# Altium footprint library RNG_Footprints.PcbLib: 134 footprints (part 8 of 9)
Each footprint in its own frame and in the unit in brackets; x right, y up, seen from the top. Pads: shape width x height; smd on the part's side, far side on the other; paste and mask are expansions set on the pad; w line width, h text height; cw(c..) or ccw(c..) is an arc to the next point about the centre after c.
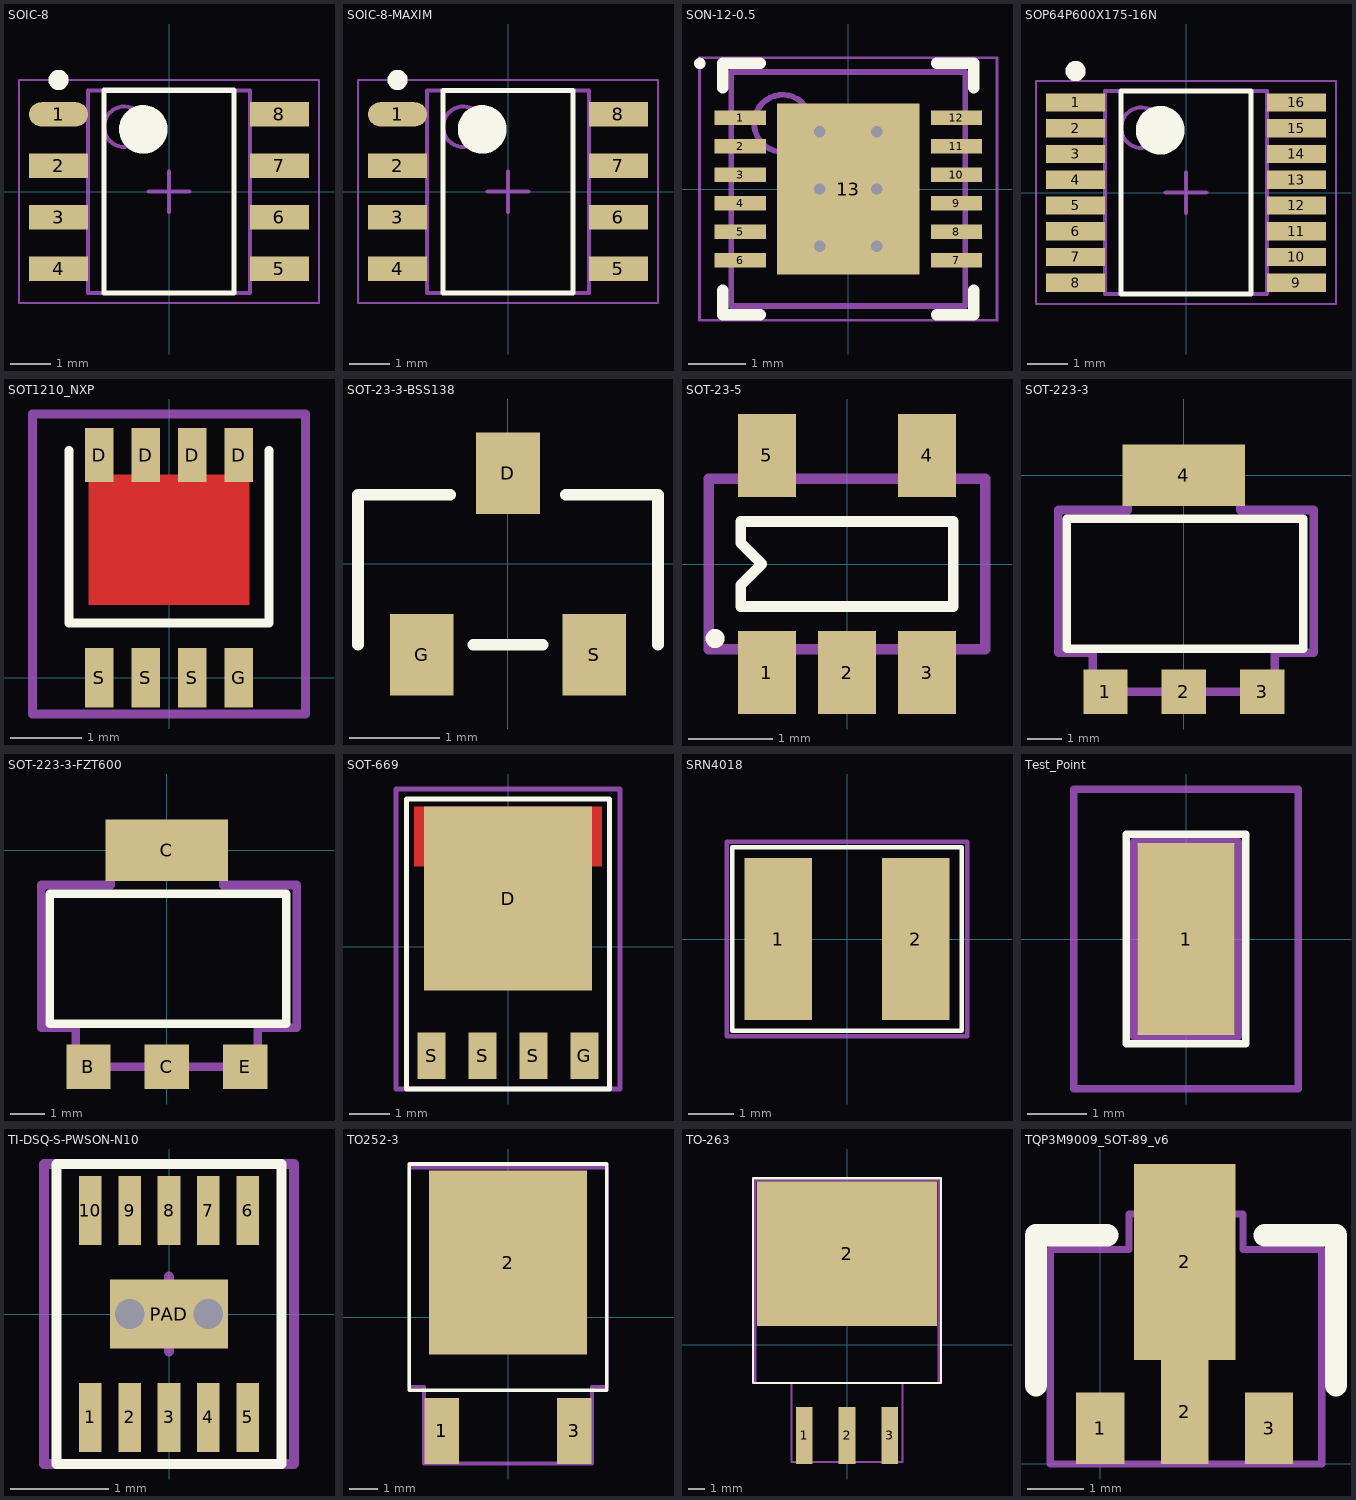
[diagram p7: the footprints below, top view; thin cyan lines are the x and y axes]

## SOIC-8 [mm] "SOIC, 8-Leads, Body 4.90x3.90mm, Pitch 1.27mm, IPC Medium Density"
height 1.75
pads (8):
  oval 1.45x0.6 smd: 1(-2.725,1.905)
  rect 1.45x0.6 smd: 2(-2.725,0.635) 3(-2.725,-0.635) 4(-2.725,-1.905) 5(2.725,-1.905) 6(2.725,-0.635) 7(2.725,0.635) 8(2.725,1.905)
Top Overlay:
  circle w0.6: c-0.637,1.536 r0.3
  circle w0.25: c-2.725,2.755 r0.125
  lines w0.127: -1.6,-2.5 1.6,-2.5 1.6,2.5 -1.6,2.5 -1.6,-2.5
Mechanical 13:
  circle w0.1: c-1.1,1.6 r0.5
  lines w0.1: -2,-2.5 2,-2.5 2,2.5 -2,2.5 -2,-2.5
Mechanical 15:
  lines w0.05: -3.7,-2.75 3.7,-2.75 3.7,2.75 -3.7,2.75 -3.7,-2.75
  lines w0.1: -0.5,0 0.5,0 ; 0,-0.5 0,0.5
3D body "User Library-SOIC127P500X620X175-8.STEP": height 1.75, standoff 0, extent -3.114,-2.5 3.115,2.5

## SOIC-8-MAXIM [mm] "SOIC, 8-Leads, Body 4.90x3.90mm, Pitch 1.27mm, IPC Medium Density"
height 1.75
pads (8):
  oval 1.45x0.6 smd: 1(-2.725,1.905)
  rect 1.45x0.6 smd: 2(-2.725,0.635) 3(-2.725,-0.635) 4(-2.725,-1.905) 5(2.725,-1.905) 6(2.725,-0.635) 7(2.725,0.635) 8(2.725,1.905)
Top Overlay:
  circle w0.25: c-2.725,2.755 r0.125
  circle w0.6: c-0.638,1.538 r0.3
  lines w0.125: -1.6,-2.5 -1.6,2.5 1.6,2.5 1.6,-2.5 -1.6,-2.5
Mechanical 13:
  circle w0.1: c-1.1,1.6 r0.5
  lines w0.1: -2,-2.5 -2,2.5 2,2.5 2,-2.5 -2,-2.5
Mechanical 15:
  lines w0.05: -3.7,-2.75 -3.7,2.75 3.7,2.75 3.7,-2.75 -3.7,-2.75
  lines w0.1: -0.5,0 0.5,0 ; 0,-0.5 0,0.5
3D body "SW3DPS-SO-8-DEFAULT.STEP": height 1.46, standoff 0.01, extent -2.889,-2.413 2.889,2.489

## SON-12-0.5 [mm] "SON, 12-Leads, Body 4.00x4.00mm, Pitch 0.50mm, Thermal Pad 3.00x2.49mm, IPC Medium Density"
height 0.8
pads (13):
  rect 0.9x0.25 smd mask+0: 1(-1.895,1.25) 2(-1.895,0.75) 3(-1.895,0.25) 4(-1.895,-0.25) 5(-1.895,-0.75) 6(-1.895,-1.25) 7(1.895,-1.25) 8(1.895,-0.75) 9(1.895,-0.25) 10(1.895,0.25) 11(1.895,0.75) 12(1.895,1.25)
  rect 2.49x3 smd paste-1.245 mask+0: 13(0,0)
via -0.5,1 diameter 0.5 hole 0.2
via 0.5,1 diameter 0.5 hole 0.2
via -0.5,0 diameter 0.5 hole 0.2
via 0.5,0 diameter 0.5 hole 0.2
via -0.5,-1 diameter 0.5 hole 0.2
via 0.5,-1 diameter 0.5 hole 0.2
Top Overlay:
  circle w0.1: c-2.6,2.2 r0.05
  lines w0.2: -2.2,-1.775 -2.2,-2.2 -1.545,-2.2 ; -2.2,1.775 -2.2,2.2 -1.545,2.2 ; 1.545,-2.2 2.2,-2.2 2.2,-1.775 ; 1.545,2.2 2.2,2.2 2.2,1.775
Top Paste:
  rectangle: -1.15,0.1 -0.1,1.4
  rectangle: -1.15,-1.4 -0.1,-0.1
  rectangle: 0.1,0.1 1.15,1.4
  rectangle: 0.1,-1.4 1.15,-0.1
Mechanical 13:
  circle w0.1: c-1.15,1.15 r0.5
  lines w0.1: -2.05,-2.05 -2.05,2.05 2.05,2.05 2.05,-2.05 -2.05,-2.05
Mechanical 15:
  lines w0.05: -2.605,-2.3 -2.605,2.3 2.605,2.3 2.605,-2.3 -2.605,-2.3
  lines w0.1: -0.5,0 0.5,0 ; 0,-0.5 0,0.5
3D body "User Library-LP39798-2.STEP": height 0.81, standoff 0.01, extent -2,-2 2,2

## SOP64P600X175-16N [mm] "SOP, 16-Leads, Body 4.89x3.90mm, Pitch 0.64mm, IPC Medium Density"
height 1.75
pads (16):
  rect 1.45x0.45 smd: 1(-2.725,2.222) 2(-2.725,1.587) 3(-2.725,0.953) 4(-2.725,0.318) 5(-2.725,-0.318) 6(-2.725,-0.953) 7(-2.725,-1.587) 8(-2.725,-2.222) 9(2.725,-2.222) 10(2.725,-1.587) 11(2.725,-0.953) 12(2.725,-0.318) 13(2.725,0.318) 14(2.725,0.953) 15(2.725,1.587) 16(2.725,2.222)
Top Overlay:
  circle w0.6: c-0.638,1.538 r0.3
  circle w0.25: c-2.725,2.997 r0.125
  lines w0.125: -1.6,-2.5 1.6,-2.5 1.6,2.5 -1.6,2.5 -1.6,-2.5
Mechanical 13:
  circle w0.1: c-1.1,1.6 r0.5
  lines w0.1: -2,-2.5 2,-2.5 2,2.5 -2,2.5 -2,-2.5
Mechanical 15:
  lines w0.05: -3.7,-2.75 3.7,-2.75 3.7,2.75 -3.7,2.75 -3.7,-2.75
  lines w0.1: -0.5,0 0.5,0 ; 0,-0.5 0,0.5
3D body "SW3dPS-SSOP16.STEP": height 1.1, standoff 0, extent -2.997,-2.489 2.997,2.489

## SOT1210_NXP [mm] "NXP SOT-1210 Footprint for LFPAK33"
height 0.9
pads (8):
  rect 0.4x0.75 smd paste-0.05 mask+0.05: D(-0.975,3.11) D(-0.325,3.11) D(0.325,3.11) D(0.975,3.11)
  rect 0.4x0.83 smd paste-0.05 mask+0.05: G(0.975,0) S(-0.975,0) S(-0.325,0) S(0.325,0)
Top Layer:
  rectangle: -1.125,1.015 1.125,2.835
Top Overlay:
  lines w0.127: -1.397,3.175 -1.397,0.762 1.397,0.762 1.397,3.175
Top Paste:
  rectangle: 0.308,1.902 0.944,2.412
  rectangle: -0.944,1.902 -0.308,2.412
  rectangle: 0.308,1.14 0.944,1.65
  rectangle: -0.944,1.14 -0.308,1.65
Mechanical 15:
  lines w0.125: -1.905,-0.508 1.905,-0.508 1.905,3.683 -1.905,3.683 -1.905,-0.508
3D body: height 0.9, standoff 0, extent -1.7,0.602 1.7,3.302

## SOT-23-3-BSS138 [mm] "SOT-23-3 Fairchild BSS138 Pinout"
height 1.12
pads (3):
  rect 0.7x0.9 smd: D(0,1) G(-0.95,-1) S(0.95,-1)
Top Overlay:
  lines w0.127: -1.651,-0.889 -1.651,0.762 -0.635,0.762 ; -0.381,-0.889 0.381,-0.889 ; 0.635,0.762 1.651,0.762 1.651,-0.889
3D body "SOT23.STEP": height 1.23, standoff 0.01, extent -1.5,-1.125 1.5,1.126

## SOT-23-5 [mm] "SOT-23, 5 Pin, for TI LP2985LV"
height 1.19
pads (5):
  rect 0.69x0.99 smd paste-0.05: 1(-0.955,-1.295) 2(0,-1.295) 3(0.955,-1.295) 4(0.955,1.295) 5(-0.955,1.295)
Top Overlay:
  circle w0.127: c-1.574,-0.889 r0.05
  lines w0.127: -1.27,-0.508 1.27,-0.508 1.27,0.508 -1.27,0.508 -1.27,0.254 -1.016,0 -1.27,-0.254 -1.27,-0.508
Mechanical 15:
  lines w0.127: -1.651,-1.016 -1.651,1.016 1.651,1.016 1.651,-1.016 -1.651,-1.016
3D body: height 1.19, standoff 0, extent -1.495,-0.835 1.495,0.835

## SOT-223-3 [mm] "SOT223 pkg, 6.7 x 7.3 x 1.8 mm"
height 1.8
pads (4):
  rect 1.3x1.3 smd paste-0.05: 1(-2.3,-6.35) 2(0,-6.35) 3(2.3,-6.35)
  rect 3.6x1.8 smd paste-0.05: 4(0,0)
Top Overlay:
  lines w0.25: -3.429,-5.08 -3.429,-1.27 3.5,-1.27 3.5,-5.08 -3.429,-5.08
Mechanical 15:
  lines w0.25: -3.683,-5.207 -3.683,-1.016 -1.651,-1.016 -1.651,0 1.651,0 1.651,-1.016 3.81,-1.016 3.81,-5.207 2.667,-5.207 2.667,-6.35 -2.667,-6.35 -2.667,-5.207 -3.683,-5.207
3D body "User Library-SOT223-3.STEP": height 1.7, standoff 0, extent -3.25,-6.675 3.25,0.325

## SOT-223-3-FZT600 [mm] "SOT223 pkg, 6.7 x 7.3 x 1.8 mm"
height 1.8
pads (4):
  rect 1.3x1.3 smd paste-0.05: B(-2.3,-6.35) C(0,-6.35) E(2.3,-6.35)
  rect 3.6x1.8 smd paste-0.05: C(0,0)
Top Overlay:
  lines w0.25: -3.429,-5.08 3.5,-5.08 3.5,-1.27 -3.429,-1.27 -3.429,-5.08
Mechanical 15:
  lines w0.25: -3.683,-5.207 -2.667,-5.207 -2.667,-6.35 2.667,-6.35 2.667,-5.207 3.81,-5.207 3.81,-1.016 1.651,-1.016 1.651,0 -1.651,0 -1.651,-1.016 -3.683,-1.016 -3.683,-5.207
3D body "User Library-SOT223-3.STEP": height 1.7, standoff 0, extent -3.25,-6.675 3.25,0.325

## SOT-669 [mm] "NXP SOT-669 for LFPAK MOSFET"
height 1.1
pads (5):
  rect 4.2x4.6 smd paste-2.3 mask+0.075: D(0,1.2)
  rect 0.7x1.15 smd mask+0.075: G(1.905,-2.725) S(-1.905,-2.725) S(-0.635,-2.725) S(0.635,-2.725)
Top Layer:
  rectangle: -2.35,2 2.35,3.5
Top Overlay:
  lines w0.127: -2.54,-3.556 2.54,-3.556 2.54,3.683 -2.54,3.683 -2.54,-3.556
Top Paste:
  rectangle: 0.889,0.889 1.789,1.489
  rectangle: -0.381,0.889 0.519,1.489
  rectangle: -1.778,0.889 -0.878,1.489
  rectangle: 0.889,0 1.789,0.6
  rectangle: -0.381,0 0.519,0.6
  rectangle: -1.778,0 -0.878,0.6
  rectangle: -1.778,-0.889 -0.878,-0.289
  rectangle: 0.889,-0.889 1.789,-0.289
  rectangle: -0.381,-0.889 0.519,-0.289
  rectangle: 1.524,2.529 2.124,3.429
  rectangle: 0.381,2.529 0.981,3.429
  rectangle: -0.889,2.529 -0.289,3.429
  rectangle: -2.124,2.54 -1.524,3.44
Mechanical 15:
  lines w0.127: -2.794,-3.556 2.54,-3.556 2.794,-3.556 2.794,3.937 -2.794,3.937 -2.794,-3.556
3D body "User Library-SOT669.STEP": height 1.2, standoff 0, extent -2.5,-3.29 2.5,3.477

## SRN4018 [mm] "Bourns SRN4018 Series SMT Semi-Shielded Power Inductor"
height 1.8
pads (2):
  rect 1.5x3.6 smd: 1(-1.525,0) 2(1.525,0)
Top Overlay:
  lines w0.1: -2.54,-2.032 -2.54,2.032 2.54,2.032 2.54,-2.032 -2.54,-2.032
Mechanical 15:
  lines w0.1: -2.667,-2.159 -2.667,2.159 2.667,2.159 2.667,-2.159 -2.667,-2.159
3D body "srn4018.stp": height 1.81, standoff 0.01, extent -2.2,-2 2.2,2

## Test_Point [mm] "Harwin S1751-46R Test Point"
height 2
pads (1):
  rect 1.65x3.25 smd: 1(0,0)
Top Overlay:
  lines w0.127: -1.016,-1.778 -1.016,1.778 1.016,1.778 1.016,-1.778 -1.016,-1.778
Mechanical 13:
  lines w0.127: -0.889,-1.651 0.889,-1.651 0.889,1.651 -0.889,1.651 -0.889,-1.651
Mechanical 15:
  lines w0.127: -1.905,-2.54 -1.905,2.54 1.905,2.54 1.905,-2.54 -1.905,-2.54

## TI-DSQ-S-PWSON-N10 [mm] "TI Plastic Small Outline No-Lead for TPS51206"
height 0.8
pads (11):
  rect 0.23x0.7 smd mask+0.05: 1(-0.8,-1.05) 2(-0.4,-1.05) 3(0,-1.05) 4(0.4,-1.05) 5(0.8,-1.05) 6(0.8,1.05) 7(0.4,1.05) 8(0,1.05) 9(-0.4,1.05) 10(-0.8,1.05)
  rect 1.2x0.7 smd mask+0.05: PAD(0,0)
via 0.4,0 diameter 0.3 hole 0.3
via -0.4,0 diameter 0.3 hole 0.3
Top Overlay:
  lines w0.1: -1.143,-1.524 1.143,-1.524 1.143,-1.016 1.143,1.016 1.143,1.524 -1.143,1.524 -1.143,1.143 -1.143,-1.143 -1.143,-1.524
  text "." at -1.651,-1.143 h1
Mechanical 15:
  lines w0.1: -0.381,0 0.381,0 ; 0,-0.381 0,0.381 ; -1.27,-1.524 1.27,-1.524 1.27,1.524 -1.27,1.524 -1.27,-1.524
3D body: height 0.8, standoff 0.05, extent -1.05,-1.05 1.05,1.05

## TO252-3 [mm] "TO252-3 Footprint for ROHM BA7807FP-E2, 7V, 1A LDO"
height 2.5
pads (3):
  rect 1.2x2.3 smd: 1(-2.3,-3.95) 3(2.3,-3.95)
  rect 5.5x6.4 smd: 2(0,1.9)
Top Overlay:
  lines w0.127: -3.429,-2.54 3.429,-2.54 3.429,5.334 -3.429,5.334 -3.429,-2.54
Mechanical 15:
  lines w0.127: -3.429,-2.413 -3.429,5.207 3.429,5.207 3.429,-2.413 2.921,-2.413 2.921,-5.08 -2.921,-5.08 -2.921,-2.413 -3.429,-2.413
3D body: height 1.2, standoff 0, extent -2.675,-4.786 2.675,-2.286
3D body: height 2.5, standoff 0, extent -3.35,-2.286 3.35,3.414
3D body: height 0.6, standoff 0, extent -3.35,3.429 3.35,5.129

## TO-263 [mm] "KTT TO-263 Land for TI TL780 LDO"
height 4.83
pads (4):
  rect 1x3.4 smd paste-0.07: 1(-2.54,-5.4) 2(0,-5.4) 3(2.54,-5.4)
  rect 10.7x8.6 smd paste-0.07: 2(0,5.4)
Top Overlay:
  lines w0.127: -5.588,-2.286 -5.588,9.906 5.588,9.906 5.588,-2.286 -5.588,-2.286
Mechanical 15:
  lines w0.127: -5.461,-2.286 -5.461,9.779 5.461,9.779 5.461,-2.286 3.302,-2.286 3.302,-6.985 -3.302,-6.985 -3.302,-2.286 -5.461,-2.286
3D body: height 3.63, standoff 0, extent -3.11,-6.582 3.11,-2.032
3D body: height 1.4, standoff 0, extent -5.335,7.591 5.335,9.271
3D body: height 4.83, standoff 0, extent -5.335,-2.059 5.335,7.591

## TQP3M9009_SOT-89_v6 [mm] "SOT-89_Vias_Backplane"
height 0.036
pads (4):
  rect 0.86x1.27 smd: 1(0,0.635) 3(3,0.635)
  rect 0.84x1.85 smd: 2(1.5,0.925)
  rect 1.8x3.48 smd: 2(1.5,3.59)
Top Overlay:
  lines w0.4: -1.143,1.397 -1.143,4.064 0.127,4.064 ; 2.921,4.064 4.191,4.064 4.191,1.397
Mechanical 15:
  lines w0.127: -0.889,0 3.937,0 3.937,3.81 2.54,3.81 2.54,4.445 0.508,4.445 0.508,3.81 -0.889,3.81 -0.889,0
3D body: height 1.6, standoff 0, extent -0.79,1.143 3.81,3.743